# Altium footprint library AD_Lib.PcbLib: 508 footprints (part 14 of 32)
Each footprint in its own frame and in the unit in brackets; x right, y up, seen from the top. Pads: shape width x height; smd on the part's side, far side on the other; paste and mask are expansions set on the pad; w line width, h text height; cw(c..) or ccw(c..) is an arc to the next point about the centre after c.
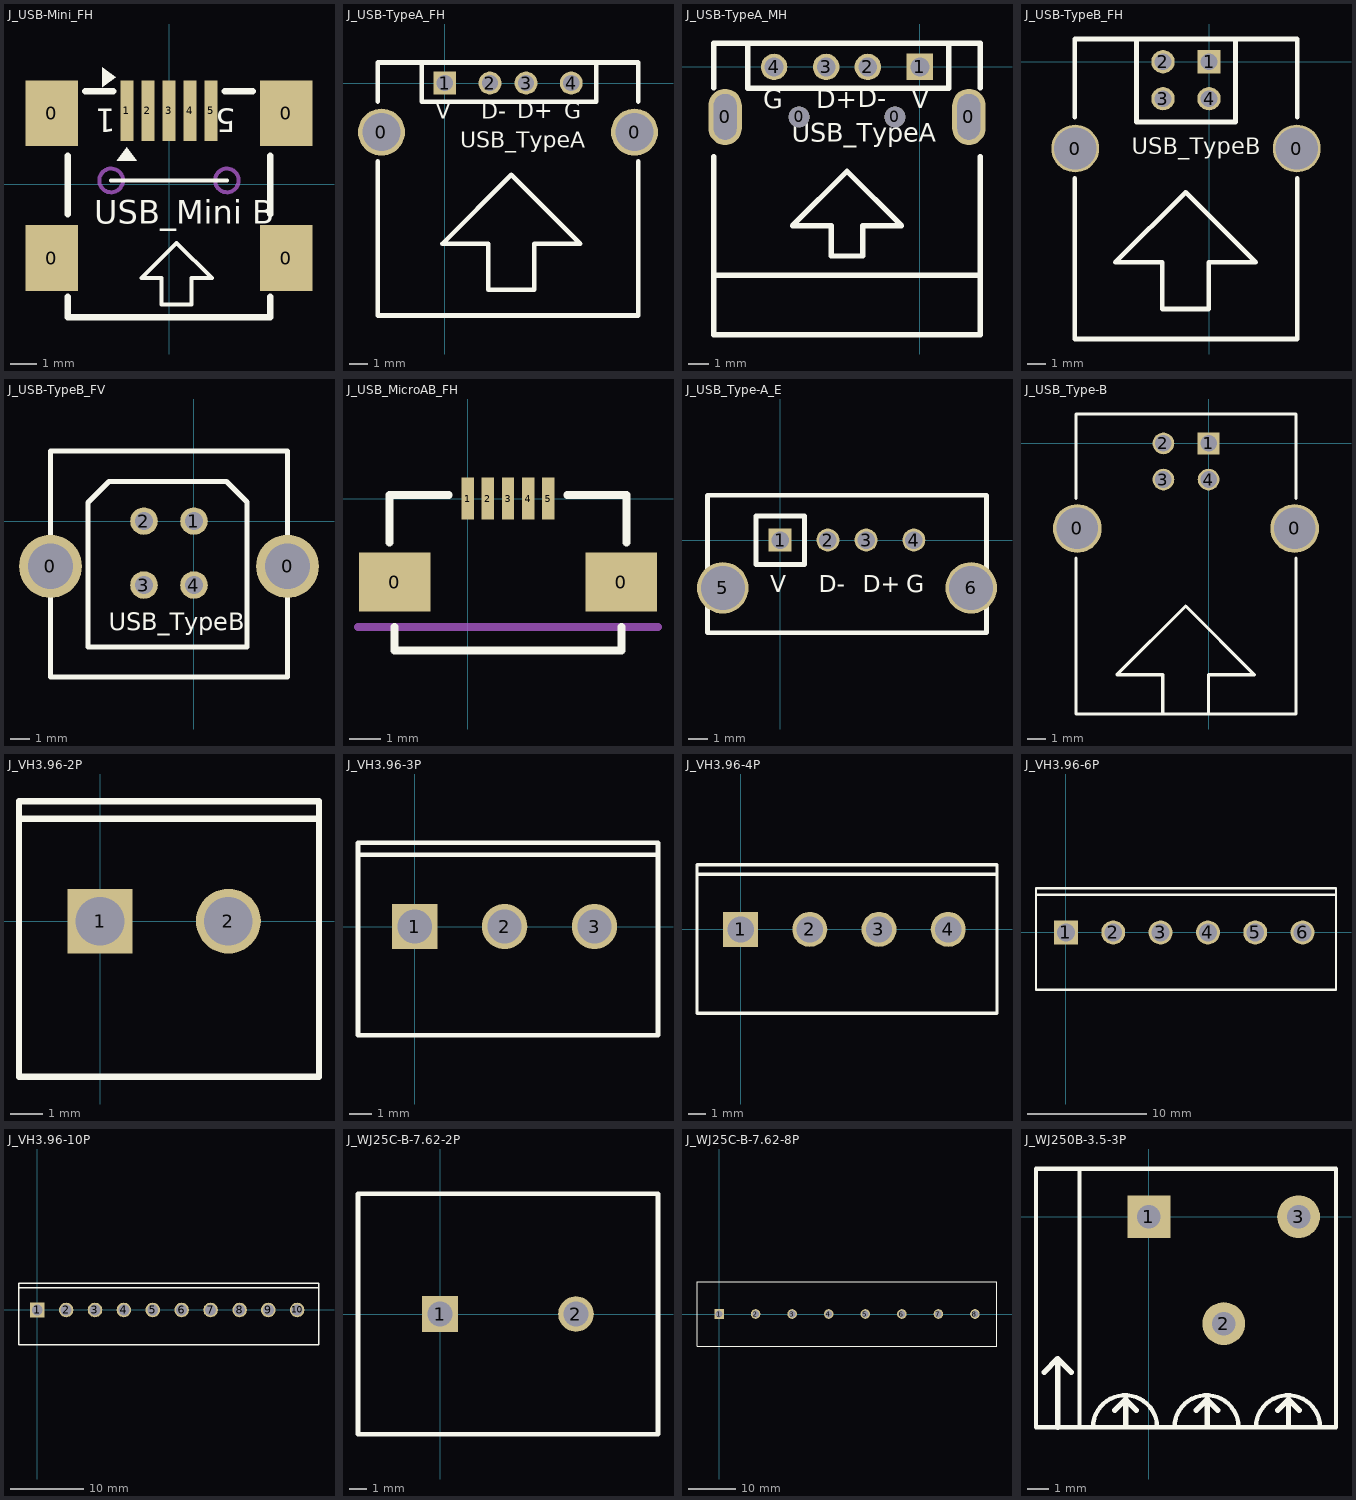
[diagram p13: the footprints below, top view; thin cyan lines are the x and y axes]

## J_USB-Mini_FH [mm] "USB - Mini，母座，SMT；920-462A2021S10108（C105424）"
height 2.8
pads (9):
  rect 2x2.5 smd: 0(-4.45,-2.8) 0(-4.45,2.7) 0(4.45,-2.8) 0(4.45,2.7)
  rect 0.5x2.3 smd: 1(-1.6,2.8) 2(-0.8,2.8) 3(0,2.8) 4(0.8,2.8) 5(1.6,2.8)
Top Overlay:
  region: -1.981,0.895 -1.6,1.403 -1.219,0.895
  region: -2.54,4.445 -2.032,4.064 -2.54,3.683
  lines w0.152: -2.21,0.15 2.21,0.15 ; -1.041,-3.556 -0.025,-2.54 0.292,-2.222 1.626,-3.556 1.499,-3.556 0.864,-3.556 0.864,-4.572 -0.279,-4.572 -0.279,-3.556 -1.041,-3.556
  lines w0.254: -3.85,-1.129 -3.85,1.081 ; -3.85,-4.268 -3.85,-5.05 3.85,-5.05 3.85,-4.268 ; -3.186,3.545 -2.119,3.545 ; 2.119,3.545 3.186,3.545 ; 3.85,-1.129 3.85,1.081
  text "USB_Mini B" at -2.845,-1.803 h1.52
  text "1" at -2.032,3.175 h1.52
  text "5" at 2.54,3.175 h1.52
Mechanical 1:
  circle w0.152: c2.2,0.15 r0.45
  circle w0.152: c-2.2,0.15 r0.45

## J_USB-TypeA_FH [mm] "USB - Type A，母座，水平安装；902-131A1011D10100（C2345）"
height 7
pads (6):
  round 2.6 hole 2.1: 0(-3.5,-2.71) 0(10.5,-2.71)
  rect 1.27x1.27 hole 0.9: 1(0,0)
  round 1.27 hole 0.9: 2(2.5,0) 3(4.5,0) 4(7,0)
Top Overlay:
  lines w0.254: -3.7,-4.318 -3.7,-12.86 10.7,-12.86 10.7,-4.318 ; -3.7,-1.016 -3.7,1.14 10.7,1.14 10.7,-1.016 ; -1.267,1.14 -1.267,-1.025 8.382,-1.025 8.382,1.14 ; -0.127,-8.89 2.413,-8.89 2.413,-11.43 4.953,-11.43 4.953,-8.89 7.493,-8.89 3.683,-5.08 -0.127,-8.89
  text "D-" at 2.032,-2.286 h1.52
  text "D+" at 4.008,-2.244 h1.52
  text "V" at -0.508,-2.286 h1.52
  text "G" at 6.604,-2.286 h1.52
  text "USB_TypeA" at 0.858,-3.895 h1.52
Bottom Overlay:
  text "D-" at 2.921,-2.286 h1.52
  text "D+" at 5.207,-2.286 h1.52
  text "V" at 0.381,-2.286 h1.52
  text "G" at 7.493,-2.286 h1.52

## J_USB-TypeA_MH [mm] "USB - Type A，公头，水平安装；917-181A102ED60200（C9739）"
height 4.5
pads (8):
  oval 1.6x2.7 hole 1.1 slot 2.2 at 90 deg: 0(-9.35,-2.4) 0(2.35,-2.4)
  round 1 hole 1: 0(-5.8,-2.4) 0(-1.2,-2.4)
  rect 1.27x1.27 hole 0.9: 1(0,0)
  round 1.27 hole 0.9: 2(-2.5,0) 3(-4.5,0) 4(-7,0)
Top Overlay:
  lines w0.254: -9.9,-10 2.9,-10 ; -9.9,-4.318 -9.9,-12.86 2.9,-12.86 2.9,-4.318 ; -9.9,-1.016 -9.9,1.14 2.9,1.14 2.9,-1.016 ; -8.267,1.14 -8.267,-1.025 1.382,-1.025 1.382,1.14 ; -6.11,-7.62 -3.5,-5.01 -0.89,-7.62 -2.738,-7.62 -2.738,-9.074 -4.262,-9.074 -4.262,-7.62 -6.11,-7.62
  text "D+" at -4.968,-2.286 h1.52
  text "D-" at -2.992,-2.244 h1.52
  text "G" at -7.508,-2.286 h1.52
  text "V" at -0.396,-2.286 h1.52
  text "USB_TypeA" at -6.142,-3.895 h1.52
Bottom Overlay:
  text "D+" at -4.079,-2.286 h1.52
  text "D-" at -1.793,-2.286 h1.52
  text "G" at -6.619,-2.286 h1.52
  text "V" at 0.493,-2.286 h1.52

## J_USB-TypeB_FH [mm] "USB - Type B，母座，水平安装；921-111A1010D1020（C46392）"
height 10.9
pads (6):
  round 2.6 hole 2.3: 0(-7.27,-4.71) 0(4.77,-4.71)
  rect 1.27x1.27 hole 0.9: 1(0,0)
  round 1.27 hole 0.9: 2(-2.5,0) 3(-2.5,-2) 4(0,-2)
Top Overlay:
  lines w0.254: -7.3,-6.318 -7.3,-15.06 4.8,-15.06 4.8,-6.318 ; -7.3,-3.016 -7.3,1.24 4.8,1.24 4.8,-3.016 ; -3.942,1.24 -3.942,-3.27 1.442,-3.27 1.442,1.24 ; -5.085,-10.889 -1.275,-7.079 2.535,-10.889 -0.005,-10.889 -0.005,-13.429 -2.545,-13.429 -2.545,-10.889 -5.085,-10.889
  text "USB_TypeB" at -4.191,-5.309 h1.52
Bottom Overlay:
  text "D-" at -3.536,-0.475 h1.52
  text "D+" at -3.536,-2.482 h1.52
  text "V" at 1.925,-0.577 h1.52
  text "G" at 1.925,-2.609 h1.52

## J_USB-TypeB_FV [mm] "USB - Type B，母座，垂直安装；921-111A1010Y10200（C26234）"
height 16.4
pads (6):
  round 3.2 hole 2.3: 0(-7.29,-2.299) 0(4.75,-2.299)
  round 1.4 hole 0.92: 1(0,0) 2(-2.54,0) 3(-2.54,-3.25) 4(0,-3.25)
Top Overlay:
  lines w0.254: -7.29,-7.924 4.75,-7.924 4.75,3.563 -7.29,3.563 -7.29,-7.924 ; -5.385,-6.4 -5.385,0.941 -4.318,2.008 1.651,2.008 2.692,0.966 2.692,-6.4 -5.385,-6.4
  text "USB_TypeB" at -4.318,-5.842 h1.52
Bottom Overlay:
  text "V" at 1.925,-0.577 h1.52
  text "G" at 1.925,-3.859 h1.52
  text "D+" at -3.576,-3.732 h1.52
  text "D-" at -3.576,-0.475 h1.52

## J_USB_MicroAB_FH [mm] "USB connector; Micro-AB Receptacle; SMT"
height 2.8
pads (7):
  rect 2.3x1.9 smd: 0(-2.35,-2.685) 0(4.95,-2.685)
  rect 0.4x1.35 smd: 1(0,0) 2(0.65,0) 3(1.3,0) 4(1.95,0) 5(2.6,0)
Top Overlay:
  lines w0.254: -2.51,-1.415 -2.51,0.109 -0.605,0.109 ; -2.35,-4.135 -2.35,-4.885 4.95,-4.885 4.95,-4.135 ; 3.205,0.109 5.11,0.109 5.11,-1.415
Mechanical 13:
  lines w0.254: -3.526,-4.135 6.126,-4.135
  text "PCB edge" at -0.224,-3.701 h0.76

## J_USB_Type-A_E [mm] "USB2.0母座 A型 立式直插"
height 13.7
pads (6):
  rect 1.2x1.2 hole 0.92: 1(0,0)
  round 1.2 hole 0.92: 2(2.5,0) 3(4.5,0) 4(7,0)
  round 2.7 hole 2.3: 5(-3,-2.5) 6(10,-2.5)
Top Overlay:
  lines w0.254: -3.8,-4.851 10.8,-4.851 10.8,2.349 -3.8,2.349 -3.8,-4.851 ; -1.27,-1.27 1.27,-1.27 1.27,1.27 -1.27,1.27 -1.27,-1.27
  text "D-" at 2.032,-3.048 h1.52
  text "D+" at 4.318,-3.048 h1.52
  text "V" at -0.508,-3.048 h1.52
  text "G" at 6.604,-3.048 h1.52
Bottom Overlay:
  text "D-" at 2.921,-3.048 h1.52
  text "D+" at 5.207,-3.048 h1.52
  text "V" at 0.381,-3.048 h1.52
  text "G" at 7.493,-3.048 h1.52

## J_USB_Type-B [mm] "USB connector; Type-B Receptacle; TH"
height 10.8
pads (6):
  round 2.7 hole 2.3: 0(-7.27,-4.71) 0(4.77,-4.71)
  rect 1.2x1.2 hole 0.92: 1(0,0)
  round 1.2 hole 0.92: 2(-2.5,0) 3(-2.5,-2) 4(0,-2)
Top Overlay:
  lines w0.178: -7.35,-6.35 -7.35,-14.99 4.85,-14.99 4.85,-6.35 ; -7.35,-3.048 -7.35,1.63 4.85,1.63 4.85,-3.048 ; -2.54,-14.99 -2.54,-12.815 -5.08,-12.815 -1.27,-9.005 2.538,-12.813 ; 0,-14.99 0,-12.815 2.535,-12.815
Bottom Overlay:
  text "1" at 1.651,-0.635 h2.03
  text "2" at -3.556,-0.635 h2.03
  text "4" at 1.651,-2.667 h2.03
  text "3" at -3.556,-2.54 h2.03

## J_VH3.96-2P [mm]
height 2.642
pads (2):
  rect 2x2 hole 1.5 square: 1(0,0)
  round 2 hole 1.5: 2(3.96,0)
Top Overlay:
  lines w0.2: -2.5,3.167 6.756,3.167 ; -2.5,-4.8 6.756,-4.8 6.756,3.7 -2.5,3.7 -2.5,-4.8

## J_VH3.96-3P [mm]
height 2.642
pads (3):
  rect 2x2 hole 1.5 square: 1(0,0)
  round 2 hole 1.5: 2(3.96,0) 3(7.92,0)
Top Overlay:
  lines w0.2: -2.5,3.167 10.716,3.167 ; 10.668,-4.8 -2.5,-4.8 -2.5,3.7 10.716,3.7 10.716,-4.8

## J_VH3.96-4P [mm]
height 2.642
pads (4):
  rect 2x2 hole 1.5 square: 1(0,0)
  round 2 hole 1.5: 2(3.96,0) 3(7.92,0) 4(11.88,0)
Top Overlay:
  lines w0.2: -2.5,3.167 14.676,3.167 ; -2.5,-4.8 14.676,-4.8 14.676,3.7 -2.5,3.7 -2.5,-4.8

## J_VH3.96-6P [mm]
height 2.642
pads (6):
  rect 2x2 hole 1.5 square: 1(0,0)
  round 2 hole 1.5: 2(3.96,0) 3(7.92,0) 4(11.88,0) 5(15.84,0) 6(19.8,0)
Top Overlay:
  lines w0.2: -2.5,3.167 22.596,3.167 ; -2.5,-4.8 22.596,-4.8 22.596,3.7 -2.5,3.7 -2.5,-4.8

## J_VH3.96-10P [mm]
height 2.642
pads (10):
  rect 2x2 hole 1.5 square: 1(0,0)
  round 2 hole 1.5: 2(3.96,0) 3(7.92,0) 4(11.88,0) 5(15.84,0) 6(19.8,0) 7(23.76,0) 8(27.754,0) 9(31.68,0) 10(35.64,0)
Top Overlay:
  lines w0.2: -2.475,3.048 38.633,3.048 ; -2.5,-4.8 38.608,-4.8 38.608,3.7 -2.5,3.7 -2.5,-4.8

## J_WJ25C-B-7.62-2P [mm] "康奈克之栅栏端子，引脚间距7.62mm"
pads (2):
  rect 2x2 hole 1.4: 1(0,0)
  round 2 hole 1.4: 2(7.625,0)
Top Overlay:
  lines w0.254: -4.6,-6.75 -4.6,6.75 12.225,6.75 12.225,-6.75 -4.6,-6.75

## J_WJ25C-B-7.62-8P [mm] "康奈克之栅栏端子，引脚间距7.62mm"
height 15
pads (8):
  rect 2x2 hole 1.4: 1(0,0)
  round 2 hole 1.4: 2(7.625,0) 3(15.25,0) 4(22.875,0) 5(30.5,0) 6(38.125,0) 7(45.75,0) 8(53.376,0)
Top Overlay:
  lines w0.254: -4.6,-6.75 -4.6,6.75 57.975,6.75 57.975,-6.75 -4.6,-6.75

## J_WJ250B-3.5-3P [mm] "弹簧式接线端子，可拼接；引脚间距3.5mm"
height 13.2
pads (3):
  rect 2x2 hole 1.1: 1(0,0)
  round 2 hole 1.1: 2(3.5,-5) 3(7,0)
Top Overlay:
  lines w0.2: -5.282,-9.815 -5.282,2.25 ; -2.615,-9.85 cw(c-1.115,-9.85) 0.385,-9.85 ; 1.195,-9.85 cw(c2.695,-9.85) 4.195,-9.85 ; 5.005,-9.85 cw(c6.505,-9.85) 8.005,-9.85
  lines w0.203: -5.282,-9.85 -3.25,-9.85 ; -5.282,2.25 -3.25,2.25 8.75,2.25 8.75,-9.85 -3.25,-9.85 ; -3.25,2.215 -3.25,-9.85
  lines w0.254: -4.901,-7.275 -4.266,-6.64 ; -4.266,-9.85 -4.266,-6.64 ; -3.631,-7.275 -4.266,-6.64 ; -1.599,-9.053 -1.091,-8.545 ; -1.091,-9.688 -1.091,-8.545 ; -0.583,-9.053 -1.091,-8.545 ; 2.211,-9.053 2.719,-8.545 ; 2.719,-9.688 2.719,-8.545 ; 3.227,-9.053 2.719,-8.545 ; 6.021,-9.053 6.529,-8.545 ; 6.529,-9.688 6.529,-8.545 ; 7.037,-9.053 6.529,-8.545